# Altium footprint library pinghengche.PcbLib: 128 footprints (part 8 of 8)
Each footprint in its own frame and in the unit in brackets; x right, y up, seen from the top. Pads: shape width x height; smd on the part's side, far side on the other; paste and mask are expansions set on the pad; w line width, h text height; cw(c..) or ccw(c..) is an arc to the next point about the centre after c.
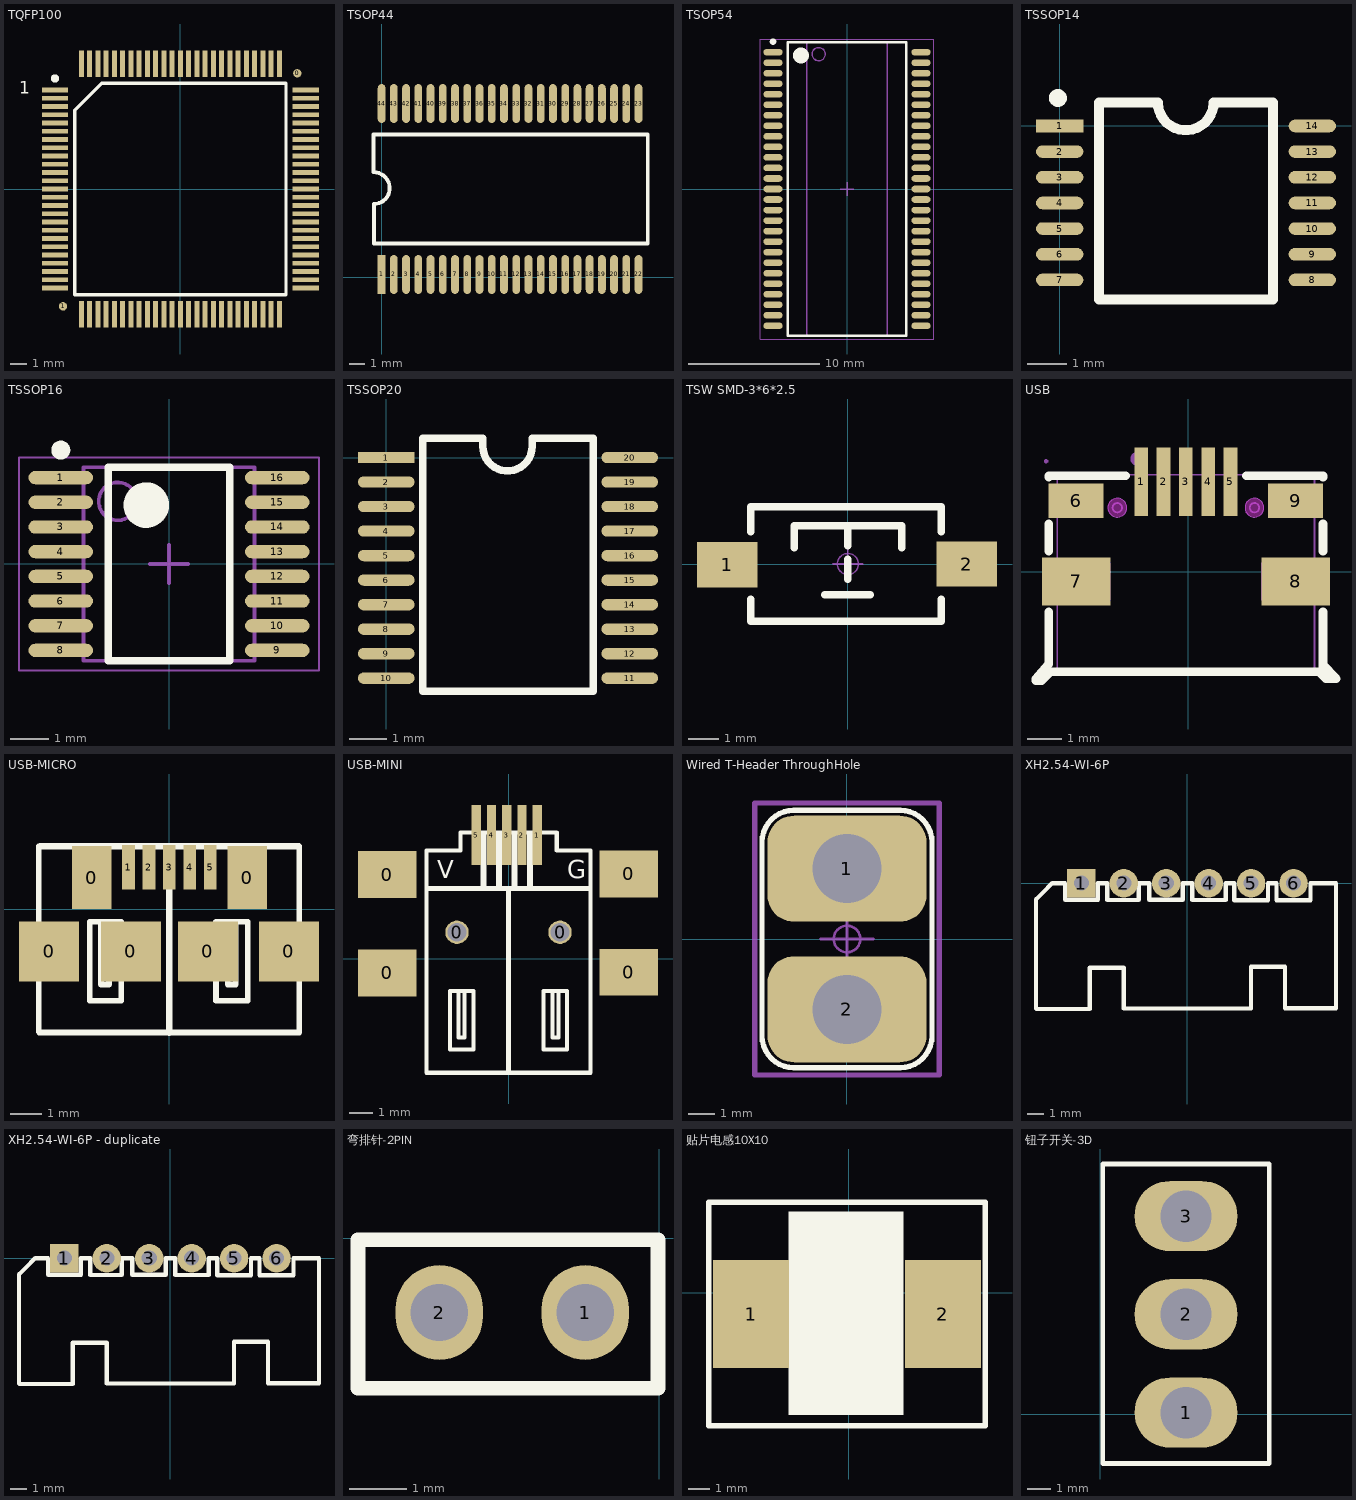
[diagram p7: the footprints below, top view; thin cyan lines are the x and y axes]

## TQFP100 [mm]
pads (102):
  round 0.508 smd: 0(7.087,7.01) 1(-7.112,-7.112)
  rect 1.6x0.3 smd: 1(-7.6,6) 2(-7.6,5.5) 3(-7.6,5) 4(-7.6,4.5) 5(-7.6,4) 6(-7.6,3.5) 7(-7.6,3) 8(-7.6,2.5) 9(-7.6,2) 10(-7.6,1.5) 11(-7.6,1) 12(-7.6,0.5) 13(-7.6,0) 14(-7.6,-0.5) 15(-7.6,-1) 16(-7.6,-1.5) 17(-7.6,-2) 18(-7.6,-2.5) 19(-7.6,-3) 20(-7.6,-3.5) 21(-7.6,-4) 22(-7.6,-4.5) 23(-7.6,-5) 24(-7.6,-5.5) 25(-7.6,-6) 51(7.6,-6) 52(7.6,-5.5) 53(7.6,-5) 54(7.6,-4.5) 55(7.6,-4) 56(7.6,-3.5) 57(7.6,-3) 58(7.6,-2.5) 59(7.6,-2) 60(7.6,-1.5) 61(7.6,-1) 62(7.6,-0.5) 63(7.6,0) 64(7.6,0.5) 65(7.6,1) 66(7.6,1.5) 67(7.6,2) 68(7.6,2.5) 69(7.6,3) 70(7.6,3.5) 71(7.6,4) 72(7.6,4.5) 73(7.6,5) 74(7.6,5.5) 75(7.6,6)
  rect 0.3x1.6 smd: 26(-6,-7.6) 27(-5.5,-7.6) 28(-5,-7.6) 29(-4.5,-7.6) 30(-4,-7.6) 31(-3.5,-7.6) 32(-3,-7.6) 33(-2.5,-7.6) 34(-2,-7.6) 35(-1.5,-7.6) 36(-1,-7.6) 37(-0.5,-7.6) 38(0,-7.6) 39(0.5,-7.6) 40(1,-7.6) 41(1.5,-7.6) 42(2,-7.6) 43(2.5,-7.6) 44(3,-7.6) 45(3.5,-7.6) 46(4,-7.6) 47(4.5,-7.6) 48(5,-7.6) 49(5.5,-7.6) 50(6,-7.6) 76(6,7.6) 77(5.5,7.6) 78(5,7.6) 79(4.5,7.6) 80(4,7.6) 81(3.5,7.6) 82(3,7.6) 83(2.5,7.6) 84(2,7.6) 85(1.5,7.6) 86(1,7.6) 87(0.5,7.6) 88(0,7.6) 89(-0.5,7.6) 90(-1,7.6) 91(-1.5,7.6) 92(-2,7.6) 93(-2.5,7.6) 94(-3,7.6) 95(-3.5,7.6) 96(-4,7.6) 97(-4.5,7.6) 98(-5,7.6) 99(-5.5,7.6) 100(-6,7.6)
Top Overlay:
  circle w0.25: c-7.6,6.7 r0.125
  lines w0.2: -6.4,-6.4 -6.4,4.776 -4.776,6.4 6.4,6.4 6.4,-6.4 -6.4,-6.4
  text "1" at -9.779,5.766 h0.76
3D body "TQFP100.STEP": height 1.05, standoff -0.1, extent -7.949,-8.026 8.051,7.974

## TSOP44 [mil]
pads (44):
  rect 20x100 smd: 1(0,7)
  oval 20x100 smd: 2(31.5,7) 3(63,7) 4(94.5,7) 5(126,7) 6(157.5,7) 7(189,7) 8(220.5,7) 9(252,7) 10(283.5,7) 11(315,7) 12(346.5,7) 13(378,7) 14(409.5,7) 15(441,7) 16(472.5,7) 17(504,7) 18(535.5,7) 19(567,7) 20(598.5,7) 21(630,7) 22(661.5,7) 23(661.5,447) 24(630,447) 25(598.5,447) 26(567,447) 27(535.5,447) 28(504,447) 29(472.5,447) 30(441,447) 31(409.5,447) 32(378,447) 33(346.5,447) 34(315,447) 35(283.5,447) 36(252,447) 37(220.5,447) 38(189,447) 39(157.5,447) 40(126,447) 41(94.5,447) 42(63,447) 43(31.5,447) 44(0,447)
Top Overlay:
  lines w10: -20.59,270 -20.59,367 685,367 685,87 -20,87 -20,183.41 ; -20,188.4 ccw(c-20,229.2) -20,270
3D body "TSOP44.STEP": height 48.24, standoff -3.69, extent -27.46,-5 689.47,457.99

## TSOP54 [mm] "TSOP, 54-Leads, Body 22.20x6.00mm, Pitch 0.80mm, IPC Medium Density"
height 1.1
pads (54):
  oval 1.45x0.5 smd: 1(-5.625,10.4) 2(-5.625,9.6) 3(-5.625,8.8) 4(-5.625,8) 5(-5.625,7.2) 6(-5.625,6.4) 7(-5.625,5.6) 8(-5.625,4.8) 9(-5.625,4) 10(-5.625,3.2) 11(-5.625,2.4) 12(-5.625,1.6) 13(-5.625,0.8) 14(-5.625,0) 15(-5.625,-0.8) 16(-5.625,-1.6) 17(-5.625,-2.4) 18(-5.625,-3.2) 19(-5.625,-4) 20(-5.625,-4.8) 21(-5.625,-5.6) 22(-5.625,-6.4) 23(-5.625,-7.2) 24(-5.625,-8) 25(-5.625,-8.8) 26(-5.625,-9.6) 27(-5.625,-10.4) 28(5.625,-10.4) 29(5.625,-9.6) 30(5.625,-8.8) 31(5.625,-8) 32(5.625,-7.2) 33(5.625,-6.4) 34(5.625,-5.6) 35(5.625,-4.8) 36(5.625,-4) 37(5.625,-3.2) 38(5.625,-2.4) 39(5.625,-1.6) 40(5.625,-0.8) 41(5.625,0) 42(5.625,0.8) 43(5.625,1.6) 44(5.625,2.4) 45(5.625,3.2) 46(5.625,4) 47(5.625,4.8) 48(5.625,5.6) 49(5.625,6.4) 50(5.625,7.2) 51(5.625,8) 52(5.625,8.8) 53(5.625,9.6) 54(5.625,10.4)
Top Overlay:
  circle w0.6: c-3.5,10.15 r0.3
  circle w0.25: c-5.625,11.2 r0.125
  lines w0.2: -4.5,-11.15 4.5,-11.15 4.5,11.15 -4.5,11.15 -4.5,-11.15
Mechanical 13:
  circle w0.1: c-2.15,10.25 r0.5
  lines w0.1: -3.05,-11.15 3.05,-11.15 3.05,11.15 -3.05,11.15 -3.05,-11.15
Mechanical 15:
  lines w0.05: -6.6,-11.4 6.6,-11.4 6.6,11.4 -6.6,11.4 -6.6,-11.4
  lines w0.1: -0.5,0 0.5,0 ; 0,-0.5 0,0.5
3D body "tSOP-54.step": height 1.25, standoff 0, extent -5.855,-11.095 5.906,11.125

## TSSOP14 [mm]
pads (14):
  rect 1.2x0.32 smd: 1(0,0)
  oval 1.2x0.32 smd: 2(0,-0.65) 3(0,-1.3) 4(0,-1.95) 5(0,-2.6) 6(0,-3.25) 7(0,-3.9) 8(6.4,-3.9) 9(6.4,-3.25) 10(6.4,-2.6) 11(6.4,-1.95) 12(6.4,-1.3) 13(6.4,-0.65) 14(6.4,0)
Top Overlay:
  lines w0.254: 0,0.8 ccw(c-0.045,0.711) 0.026,0.781 ; 1,-4.4 5.4,-4.4 5.4,0.6 3.9,0.6 cw(c3.194,0.6) 2.487,0.6 1,0.6 1,-4.4
3D body "TSSOP14.STEP": height 1.2, standoff 0, extent 0.026,-4.506 6.426,0.594

## TSSOP16 [mm] "TSOP, 16-Leads, Body 5.00x4.40mm, Pitch 0.65mm, IPC Medium Density"
height 1.2
pads (16):
  oval 1.7x0.35 smd: 1(-2.85,2.275) 2(-2.85,1.625) 3(-2.85,0.975) 4(-2.85,0.325) 5(-2.85,-0.325) 6(-2.85,-0.975) 7(-2.85,-1.625) 8(-2.85,-2.275) 9(2.85,-2.275) 10(2.85,-1.625) 11(2.85,-0.975) 12(2.85,-0.325) 13(2.85,0.325) 14(2.85,0.975) 15(2.85,1.625) 16(2.85,2.275)
Top Overlay:
  circle w0.6: c-0.6,1.55 r0.3
  circle w0.25: c-2.85,3 r0.125
  lines w0.2: -1.6,-2.55 1.6,-2.55 1.6,2.55 -1.6,2.55 -1.6,-2.55
Mechanical 13:
  circle w0.1: c-1.35,1.65 r0.5
  lines w0.1: -2.25,-2.55 2.25,-2.55 2.25,2.55 -2.25,2.55 -2.25,-2.55
Mechanical 15:
  lines w0.05: -3.95,-2.8 3.95,-2.8 3.95,2.8 -3.95,2.8 -3.95,-2.8
  lines w0.1: -0.5,0 0.5,0 ; 0,-0.5 0,0.5
3D body "TSSOP16.step": height 1.09, standoff 0, extent -3.115,-2.515 3.165,2.485

## TSSOP20 [mm]
pads (20):
  rect 1.5x0.3 smd: 1(0,0)
  oval 1.5x0.3 smd: 2(0,-0.65) 3(0,-1.3) 4(0,-1.95) 5(0,-2.6) 6(0,-3.25) 7(0,-3.9) 8(0,-4.55) 9(0,-5.2) 10(0,-5.85) 11(6.454,-5.85) 12(6.454,-5.2) 13(6.454,-4.55) 14(6.454,-3.9) 15(6.454,-3.25) 16(6.454,-2.6) 17(6.454,-1.95) 18(6.454,-1.3) 19(6.454,-0.65) 20(6.454,0)
Top Overlay:
  lines w0.2: 0.965,-6.2 0.965,0.508 2.559,0.508 2.559,0.3 ccw(c3.214,0.3) 3.87,0.3 3.87,0.508 5.486,0.508 5.486,-6.2 0.965,-6.2
3D body "TSSOP-20.STEP": height 1.2, standoff 0, extent -0.049,-6.221 6.501,0.379

## TSW SMD-3*6*2.5 [mm] "3*6*2.5mm"
pads (2):
  rect 2x1.5 smd: 1(-3.996,-0.02) 2(3.937,0)
Top Overlay:
  lines w0.254: -3.212,-1.168 -3.212,-1.9 3.088,-1.9 3.088,-1.168 ; -3.212,1.067 -3.212,1.9 3.088,1.9 3.088,1.067 ; -1.778,0.533 -1.778,1.27 1.778,1.27 1.778,0.533 ; -0.762,-1.016 0.737,-1.016 ; 0,-0.508 0,0.152 ; 0,0.61 0,1.27
Mechanical 15:
  circle w0.05: c0,0 r0.35
  lines w0.05: -0.5,0 0.5,0 ; 0,-0.5 0,0.5
3D body "TSW SMD-3x6x2.5.STEP": height 2.59, standoff -0.03, extent -4,-1.877 4,1.623

## USB [mil]
pads (9):
  rect 15.7x78.7 smd mask+2: 1(-54.2,103) 2(-28.6,103) 3(-3,103) 4(22.6,103) 5(48.2,103)
  rect 63x39.4 smd mask+2: 6(-129,81.3) 9(123,81.3)
  rect 78.7x55.1 smd mask+2: 7(-129,-11.4) 8(123,-11.4)
Top Overlay:
  lines w10: -160.9,-106.5 -175,-123 -175,-125 -168.5,-125 -158.4,-114.9 149.7,-114.9 157.8,-123 169.3,-123 154.1,-106.5 ; -160.5,-106.5 -160.5,-48.6 -160.5,-46.1 ; -160.5,23.3 -160.5,54.5 ; -160.5,108.1 -160.5,110.1 -72.2,110.1 ; 66.2,110.1 154.5,110.1 154.5,108.1 ; 154.5,-111.3 154.5,-48.6 154.5,-46.1 ; 154.5,23.3 154.5,54.5
Keep-Out Layer:
  board cut-out: 86.5,73.3 86.5,75.45 84.86,79.42 81.82,82.46 77.85,84.1 73.55,84.1 69.58,82.46 66.54,79.42 64.9,75.45 64.9,73.3 64.9,71.15 66.54,67.18 69.58,64.14 73.55,62.5 77.85,62.5 81.82,64.14 84.86,67.18 86.5,71.15
  board cut-out: -70.9,73.3 -70.9,75.45 -72.54,79.42 -75.58,82.46 -79.55,84.1 -83.85,84.1 -87.82,82.46 -90.86,79.42 -92.5,75.45 -92.5,73.3 -92.5,71.15 -90.86,67.18 -87.82,64.14 -83.85,62.5 -79.55,62.5 -75.58,64.14 -72.54,67.18 -70.9,71.15
Mechanical 1:
  circle w0.2: c75.7,73.3 r10.8
  circle w0.2: c-81.7,73.3 r10.8
Mechanical 6:
  circle w7.9: c-58.9,129.3 r3.9
Mechanical 15:
  circle w2: c75.7,73.3 r5.4
  circle w2: c-81.7,73.3 r5.4
  region: 43.3,83.3 43.3,126.6 53.1,126.6 53.1,83.3
  region: 17.7,83.3 17.7,126.6 27.5,126.6 27.5,83.3
  region: -7.9,83.3 -7.9,126.6 1.9,126.6 1.9,83.3
  region: -33.5,83.3 -33.5,126.6 -23.7,126.6 -23.7,83.3
  region: -59.1,83.3 -59.1,126.6 -49.3,126.6 -49.3,83.3
  region: 83.6,10.3 144.6,10.3 144.6,-33 83.6,-33
  region: -150.6,10.3 -89.6,10.3 -89.6,-33 -150.6,-33
  region: 93.5,95.1 144.6,95.1 144.6,67.5 93.5,67.5
  region: -150.6,95.1 -99.5,95.1 -99.5,67.5 -150.6,67.5
  region: -161,126.6 -161,127.59 -162.41,129 -164.39,129 -165.8,127.59 -165.8,126.6 -165.8,125.61 -164.39,124.2 -162.41,124.2 -161,125.61
  lines w2: -150.6,-117.3 -150.6,111 144.6,111 144.6,-117.3 -150.6,-117.3

## USB-MICRO [mm]
pads (11):
  rect 1.9x1.9 smd: 0(-3.797,-1.333) 0(-1.206,-1.333) 0(1.232,-1.333) 0(3.797,-1.333)
  rect 1.25x2 smd: 0(-2.451,1.003) 0(2.476,1.003)
  rect 0.4x1.4 smd: 1(-1.283,1.333) 2(-0.635,1.333) 3(0.013,1.333) 4(0.66,1.333) 5(1.308,1.333)
Top Overlay:
  lines w0.178: -4.127,-3.873 -4.127,1.994 ; -4.102,-3.899 4.102,-3.899 ; -2.152,-0.394 -2.152,-2.379 -1.949,-2.379 -1.898,-2.379 -1.898,-0.394 ; 1.861,-0.394 1.861,-2.379 2.115,-2.379 2.115,-0.394 ; 4.127,-3.899 4.127,1.994 ; -2.513,-2.894 -1.513,-2.894 -1.513,-0.394 -2.513,-0.394 -2.513,-2.894 ; 1.487,-2.894 1.487,-0.394 2.487,-0.394 2.487,-2.894 1.487,-2.894
  lines w0.2: -4.077,1.994 4.102,1.994 ; 0.013,-3.91 0.013,1.968
3D body "MICRO USB.STEP": height 2.77, standoff -0.17, extent -4.1,-3.912 4.1,2.018

## USB-MINI [mm]
pads (11):
  rect 2.5x2 smd: 0(-5.178,-0.604) 0(-5.178,3.596) 0(5.135,-0.579) 0(5.135,3.621)
  round 1 hole 0.8: 0(-2.2,1.128) 0(2.2,1.128)
  rect 0.4x2.55 smd: 1(1.224,5.283) 2(0.574,5.283) 3(-0.076,5.283) 4(-0.726,5.283) 5(-1.376,5.283)
Top Overlay:
  rectangle: -1.194,3.048 -0.94,5.309
  rectangle: -0.533,3.048 -0.279,5.309
  rectangle: 0.127,3.073 0.381,5.334
  rectangle: 0.787,3.048 1.041,5.309
  lines w0.178: -2.139,-1.372 -2.139,-3.357 -1.936,-3.357 -1.885,-3.357 -1.885,-1.372 ; 1.874,-1.372 1.874,-3.357 2.128,-3.357 2.128,-1.372 ; -3.5,-4.872 3.5,-4.872 3.5,4.628 2.057,4.628 2.057,5.385 0.942,5.385 -2.057,5.385 -2.057,4.628 -2.636,4.628 -3.5,4.628 -3.5,-4.872 ; -2.5,-3.872 -2.5,-1.372 -1.5,-1.372 -1.5,-3.872 -2.5,-3.872 ; 1.5,-3.872 2.5,-3.872 2.5,-1.372 1.5,-1.372 1.5,-3.872
  lines w0.2: -3.464,3.001 3.486,3.001 ; 0,-4.851 0,2.997
  text "G" at 2.515,3.429 h0.76
  text "V" at -3.048,3.429 h0.76
3D body "5887-QQ22.STEP": height 3.9, standoff -1.05, extent -4.975,-4.631 4.925,4.369

## Wired T-Header ThroughHole [mm]
height 2
pads (2):
  rrect50% 6x4 hole 2.6: 1(0,2.65) 2(0,-2.65)
Top Overlay:
  lines w0.203: -3.2,-3.65 ccw(c-2,-3.65) -2,-4.85 2,-4.85 ccw(c2,-3.65) 3.2,-3.65 3.2,3.65 ccw(c2,3.65) 2,4.85 -2,4.85 ccw(c-2,3.65) -3.2,3.65 -3.2,-3.65
Top Component Center:
  circle w0.1: c0,0 r0.5
  lines w0.1: -1,0 1,0 ; 0,-1 0,1
Top Component Outline:
  lines w0.2: -3.475,-5.125 -3.475,5.125 3.475,5.125 3.475,-5.125 -3.475,-5.125
Top Designator:
  text ".Designator" at -2.252,-0.226 h1

## XH2.54-WI-6P [mm] "接插件，6P"
pads (6):
  rect 1.7x1.7 hole 0.9: 1(-6.35,0)
  round 1.7 hole 0.9: 2(-3.81,0) 3(-1.27,0) 4(1.27,0) 5(3.81,0) 6(6.35,0)
Top Overlay:
  lines w0.254: -2.916,0 -2.916,-0.988 -2.93,-1.002 -4.796,-1.002 -4.796,0 -5.368,0 -5.368,-0.982 -5.354,-0.996 -7.31,-0.996 -7.324,-0.982 -7.324,0 -8.1,0 -8.682,-0.582 -9.066,-0.966 -9.066,-7.502 -9.04,-7.528 -5.842,-7.528 -5.842,-5.058 -3.81,-5.058 -3.81,-7.502 3.81,-7.502 3.81,-5.006 5.842,-5.006 5.842,-7.49 8.89,-7.49 8.89,0 7.366,0 7.366,-1.016 5.334,-1.016 5.334,0 4.826,0 4.826,-1.016 2.794,-1.016 2.794,0 2.286,0 2.286,-1.002 0.282,-1.002 0.282,0 ; -2.904,0 -2.306,0 ; -2.292,-0.996 -2.292,0 ; -2.272,-0.996 -0.284,-0.996 -0.278,-0.99 -0.278,0 0.268,0
3D body "XH2_54-6P_H.STEP": height 2.89, standoff -6.21, extent -8.855,-7.446 8.845,0.254

## XH2.54-WI-6P - duplicate [mm] "接插件，6P"
pads (6):
  rect 1.7x1.7 hole 0.9: 1(-6.35,0)
  round 1.7 hole 0.9: 2(-3.81,0) 3(-1.27,0) 4(1.27,0) 5(3.81,0) 6(6.35,0)
Top Overlay:
  lines w0.254: -2.916,0 -2.916,-0.988 -2.93,-1.002 -4.796,-1.002 -4.796,0 -5.368,0 -5.368,-0.982 -5.354,-0.996 -7.31,-0.996 -7.324,-0.982 -7.324,0 -8.1,0 -8.682,-0.582 -9.066,-0.966 -9.066,-7.502 -9.04,-7.528 -5.842,-7.528 -5.842,-5.058 -3.81,-5.058 -3.81,-7.502 3.81,-7.502 3.81,-5.006 5.842,-5.006 5.842,-7.49 8.89,-7.49 8.89,0 7.366,0 7.366,-1.016 5.334,-1.016 5.334,0 4.826,0 4.826,-1.016 2.794,-1.016 2.794,0 2.286,0 2.286,-1.002 0.282,-1.002 0.282,0 ; -2.904,0 -2.306,0 ; -2.292,-0.996 -2.292,0 ; -2.272,-0.996 -0.284,-0.996 -0.278,-0.99 -0.278,0 0.268,0
3D body "XH2_54-6P_H.STEP": height 2.89, standoff -6.21, extent -8.855,-7.446 8.845,0.254

## 弯排针-2PIN [mil]
pads (2):
  oval 60x65 hole 39.37: 1(-51,-51) 2(-151.1,-51)
Top Overlay:
  lines w10: -207,-103 -207,-1 -1,-1 -1,-103 -207,-103
3D body "12572.stp": height 129.53, standoff -116.54, extent -208,-474.6 -8,-37

## 贴片电感10X10 [mm]
pads (2):
  rect 3.5x5 smd: 1(-4.531,-0.991) 2(4.353,-0.991)
Top Overlay:
  rectangle: -2.789,-5.663 2.515,3.759
  lines w0.254: -6.477,-6.172 -6.477,4.191 6.299,4.191 6.299,-6.172 -6.477,-6.172
3D body "User Library-cdrh104r.STEP": height 4, standoff 0, extent -5.428,-6.198 5.072,4.102

## 钮子开关-3D [mm] "单刀双"
pads (3):
  oval 4.4x3 hole 2.2: 1(3.658,0.067) 2(3.658,4.267) 3(3.658,8.467)
Top Overlay:
  lines w0.203: 0.102,-2.108 7.214,-2.108 7.214,10.693 0.102,10.693 0.102,-2.108
3D body "User Library-7101SYZQE_switch-toggle.STEP": height 2.83, standoff -29.55, extent -1.473,-2.069 8.687,10.644